# Altium footprint library sun_library.PcbLib: 412 footprints (part 22 of 26)
Each footprint in its own frame and in the unit in brackets; x right, y up, seen from the top. Pads: shape width x height; smd on the part's side, far side on the other; paste and mask are expansions set on the pad; w line width, h text height; cw(c..) or ccw(c..) is an arc to the next point about the centre after c.
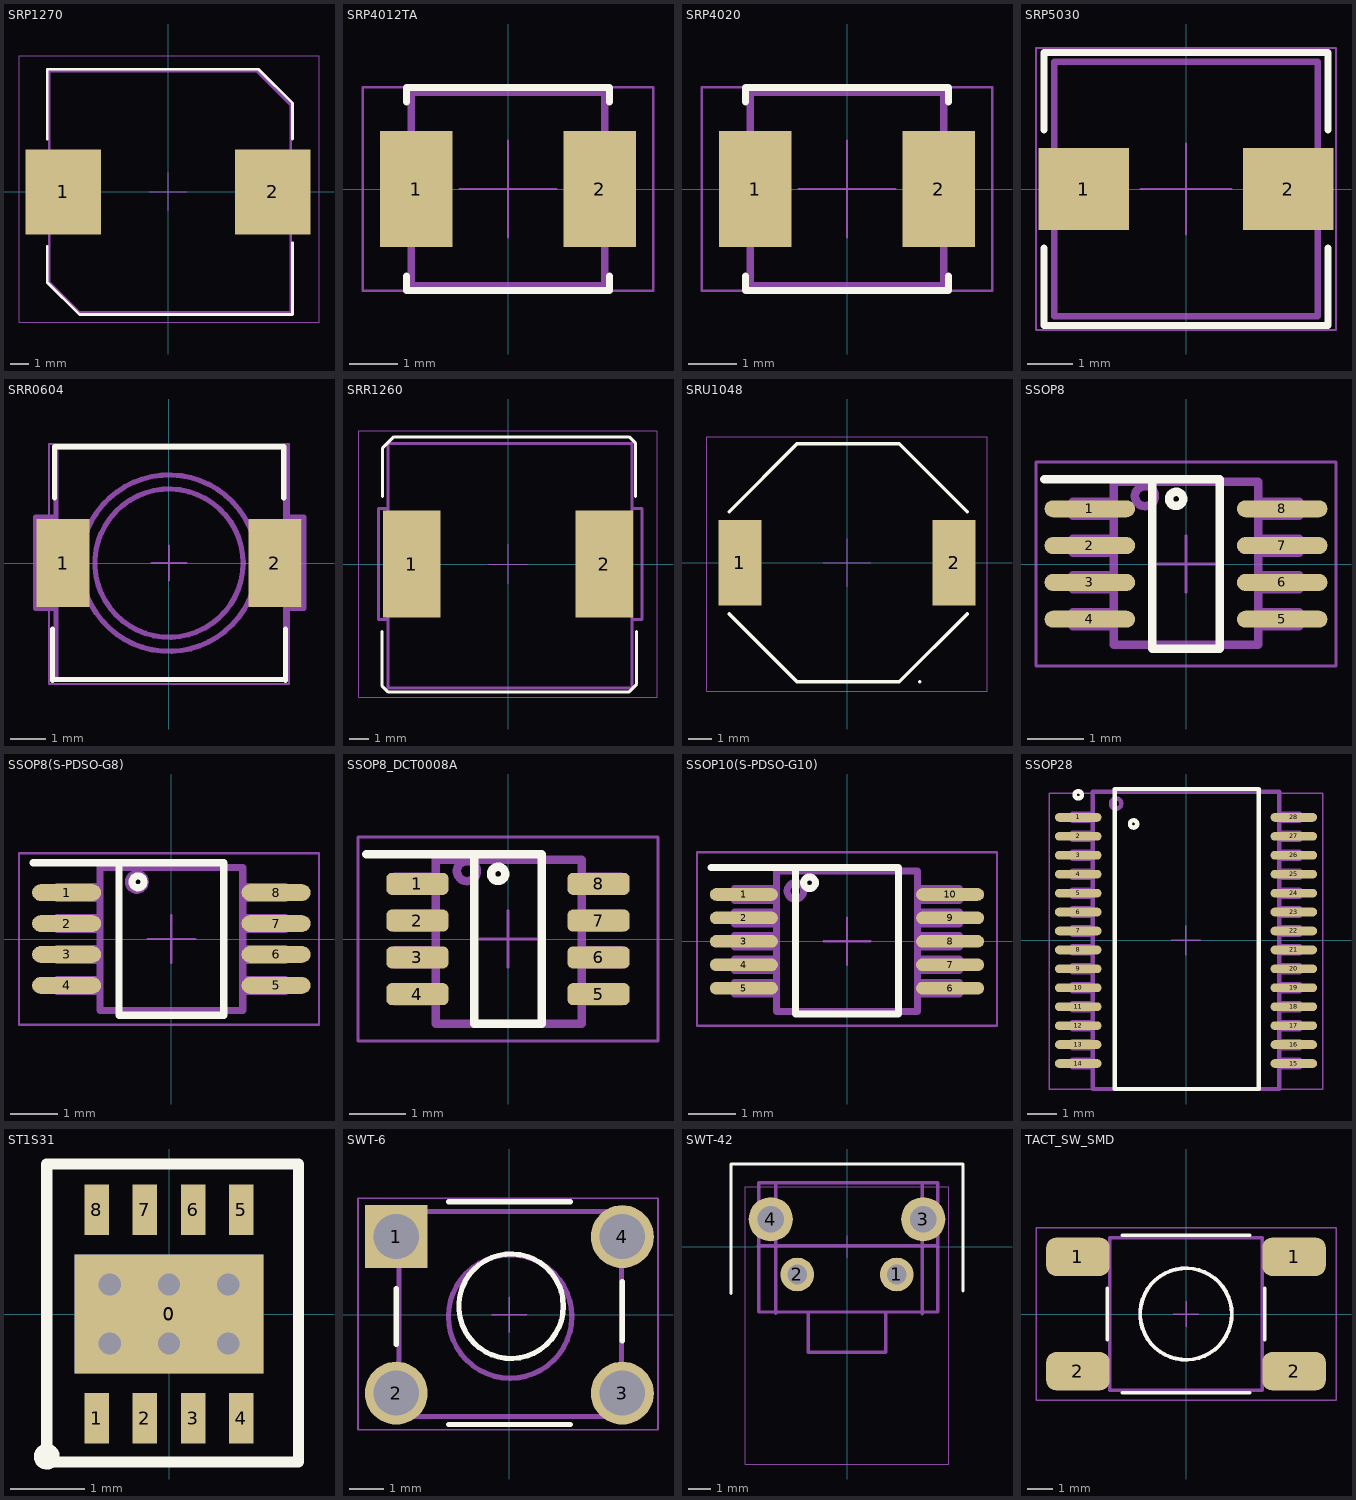
[diagram p21: the footprints below, top view; thin cyan lines are the x and y axes]

## SRP1270 [mm] "SMT power inductors, SRP1265A series BOURNS"
height 6.2
pads (2):
  rect 4x4.5 smd paste-2: 1(-5.55,0) 2(5.55,0)
Top Overlay:
  lines w0.15: -6.4,-2.9 -6.4,-4.8 -4.7,-6.5 6.6,-6.5 6.6,-2.7 ; -6.4,2.8 -6.4,6.5 4.8,6.5 6.6,4.7 6.6,2.8
Top Paste:
  region: -4,-0.3 -7.3,-0.3 -7.3,-2 -4,-2
  region: -4,2 -7.3,2 -7.3,0.3 -4,0.3
  rectangle: 4,-2 7.3,-0.3
  rectangle: 4,0.3 7.3,2
TopAssy 13:
  lines w0.15: -6.3,-2 -6.8,-2 -6.8,1.9 -6.3,1.9 ; 6.5,-2 7,-2 7,2.1 6.5,2.1 ; -6.3,-4.8 -6.3,6.4 4.7,6.4 6.5,4.6 6.5,-6.4 -4.7,-6.4 -6.3,-4.8
CourtTop 15:
  lines w0.05: -1,0 1,0 ; 0,-1 0,1 ; -7.9,-6.9 8,-6.9 8,7.2 -7.9,7.2 -7.9,-6.9
3D body "User Library-SRP1270_2RMR.step": height 7.01, standoff 0.01, extent -6.75,-6.847 6.95,6.847

## SRP4012TA [mm] "SMT power inductors, SRP4012TA series"
height 1
pads (2):
  rect 1.5x2.4 smd: 1(-1.9,0) 2(1.9,0)
Top Overlay:
  lines w0.15: -2.1,-1.8 -2.1,-2.1 2.1,-2.1 2.1,-1.8 ; -2.1,1.8 -2.1,2.1 2.1,2.1 2.1,1.8
TopAssy 13:
  lines w0.15: -2.2,-0.5 -2.2,0.5 -1.975,0.5 -1.975,-0.5 -2.2,-0.5 ; -2,-2 2,-2 2,2 -2,2 -2,-2 ; 1.975,-0.4 2.2,-0.4 2.2,0.6 1.975,0.6 1.975,-0.4
CourtTop 15:
  lines w0.05: -1,0 1,0 ; 0,-1 0,1 ; -3,-2.1 3,-2.1 3,2.1 -3,2.1 -3,-2.1
3D body "User Library-SRP-4020 Inductor.step": height 1.94, standoff -0.01, extent -2.15,-2 2.15,2

## SRP4020 [mm] "SMT power inductors, SRP4020 series, BOURNS"
height 1
pads (2):
  rect 1.5x2.4 smd: 1(-1.9,0) 2(1.9,0)
Top Overlay:
  lines w0.15: -2.1,-1.8 -2.1,-2.1 2.1,-2.1 2.1,-1.8 ; -2.1,1.8 -2.1,2.1 2.1,2.1 2.1,1.8
TopAssy 13:
  lines w0.15: -2.2,-0.5 -2.2,0.5 -1.975,0.5 -1.975,-0.5 -2.2,-0.5 ; -2,-2 2,-2 2,2 -2,2 -2,-2 ; 1.975,-0.4 2.2,-0.4 2.2,0.6 1.975,0.6 1.975,-0.4
CourtTop 15:
  lines w0.05: -1,0 1,0 ; 0,-1 0,1 ; -3,-2.1 3,-2.1 3,2.1 -3,2.1 -3,-2.1
3D body "User Library-SRP-4020 Inductor.step": height 1.94, standoff -0.01, extent -2.15,-2 2.15,2

## SRP5030 [mm] "SMT power inductors, SRP5030 series, BOURNS"
height 2.8
pads (2):
  rect 2x1.8 smd: 1(-2.25,0) 2(2.25,0)
Top Overlay:
  lines w0.15: -3.125,-1.3 -3.125,-3 3.125,-3 3.125,-1.3 ; -3.125,1.3 -3.125,3 3.125,3 3.125,1.3
TopAssy 13:
  lines w0.15: -3.1,-0.8 -3.1,0.8 -2.7,0.8 -2.7,-0.8 -3.1,-0.8 ; -2.9,-2.8 2.9,-2.8 2.9,2.8 -2.9,2.8 -2.9,-2.8 ; 2.7,-0.8 3.1,-0.8 3.1,0.8 2.7,0.8 2.7,-0.8
CourtTop 15:
  lines w0.05: -1,0 1,0 ; 0,-1 0,1 ; -3.3,-3.1 3.3,-3.1 3.3,3.1 -3.3,3.1 -3.3,-3.1
3D body "User Library-SRP-5030 Inductor.step": height 2.79, standoff -0.01, extent -3,-2.85 3,2.85

## SRR0604 [mm] "Shielded Power Inductors SRR0604 Bourns"
height 4.8
pads (2):
  rect 1.5x2.5 smd: 1(-3,0) 2(3,0)
Top Overlay:
  lines w0.15: -3.3,-3.323 -3.3,-1.877 ; -3.245,-3.3 3.255,-3.3 ; -3.245,1.855 -3.245,3.3 3.255,3.3 3.255,1.855 ; 3.3,-3.323 3.3,-1.877
TopAssy 13:
  circle w0.15: c0,0 r2.5
  circle w0.15: c0,0 r2.1
  lines w0.15: -3.2,-1.275 -3.775,-1.275 -3.775,1.3 -3.2,1.3 ; 3.3,-1.275 3.825,-1.275 3.825,1.3 3.3,1.3 ; -3.2,-3.3 -3.2,3.3 3.3,3.3 3.3,-3.3 -3.2,-3.3
CourtTop 15:
  lines w0.05: -0.5,0 0.5,0 ; 0,-0.5 0,0.5 ; -3.4,-3.425 3.4,-3.425 3.4,3.375 -3.4,3.375 -3.4,-3.425
3D body "User Library-IND-SRR0604_6x6x5.step": height 4.8, standoff 0, extent -3.2,-3.25 3.3,3.25

## SRR1260 [mm] "SMT power inductors, SRP1260 series BOURNS"
height 6.2
pads (2):
  rect 2.9x5.4 smd paste-2: 1(-4.85,0) 2(4.85,0)
Top Overlay:
  lines w0.15: -6.35,-3.4 -6.35,-6.125 -6.025,-6.45 6.075,-6.45 6.475,-6.05 6.475,-3.4 ; -6.325,3.4 -6.325,5.825 -5.75,6.4 6.1,6.4 6.425,6.075 6.425,3.4
Top Paste:
  rectangle: 3.5,0.275 6.2,2.5
  region: 6.2,-0.275 3.5,-0.275 3.5,-2.5 6.2,-2.5
  region: -3.5,-0.275 -6.2,-0.275 -6.2,-2.5 -3.5,-2.5
  rectangle: -6.2,0.275 -3.5,2.5
TopAssy 13:
  lines w0.15: -6.05,-2.8 -6.525,-2.8 -6.525,2.8 -6.05,2.8 ; 6.238,-2.8 6.738,-2.8 6.738,2.8 6.238,2.8 ; -6.05,-6.25 -6.05,6.075 6.238,6.075 6.238,-6.25 -6.05,-6.25
CourtTop 15:
  lines w0.05: -1,0 1,0 ; 0,-1 0,1 ; -7.5,-6.7 -7.5,6.7 7.5,6.7 7.5,-6.7 -7.5,-6.7
3D body "User Library-SRR1260-680M.step": height 6.3, standoff 0.01, extent -6.25,-6.25 6.25,6.25

## SRU1048 [mm] "SMT power inductors,  SRU1048 series BOURNS"
height 4.8
pads (2):
  rect 1.8x3.6 smd: 1(-4.5,0) 2(4.5,0)
Top Overlay:
  lines w0.15: -4.95,-2.15 -2.1,-5 2.2,-5 5.05,-2.15 ; -4.95,2.15 -2.1,5 2.2,5 5.05,2.15 ; 3.05,-5 3.05,-5
CourtTop 15:
  lines w0.05: -1,0 1,0 ; 0,-1 0,1 ; -5.9,-5.4 -5.9,5.3 5.9,5.3 5.9,-5.4 -5.9,-5.4
3D body "User Library-Bourns_SRU1048.step": height 5.04, standoff 0, extent -4.95,-5 5.05,5

## SSOP8 [mm] "TSOP, 8-Leads, Body 3x4.4mm, Pitch 0.65mm, IPC Medium Density"
height 1.2
pads (8):
  oval 1.6x0.3 smd: 1(-1.7,0.975) 2(-1.7,0.325) 3(-1.7,-0.325) 4(-1.7,-0.975) 5(1.7,-0.975) 6(1.7,-0.325) 7(1.7,0.325) 8(1.7,0.975)
Top Overlay:
  circle w0.15: c-0.175,1.15 r0.125
  lines w0.15: -2.5,1.5 0.6,1.5 0.6,-1.5 -0.6,-1.5 -0.6,1.5
TopAssy 13:
  circle w0.15: c-0.725,1.2 r0.177
  lines w0.15: -1.275,-1.1 -2,-1.1 -2,-0.85 -1.275,-0.85 ; -1.275,-0.45 -2,-0.45 -2,-0.2 -1.275,-0.2 ; -1.275,0.2 -2,0.2 -2,0.45 -1.275,0.45 ; -1.275,0.85 -2,0.85 -2,1.1 -1.275,1.1 ; 1.275,-1.1 2,-1.1 2,-0.85 1.275,-0.85 ; 1.275,-0.45 2,-0.45 2,-0.2 1.275,-0.2 ; 1.275,0.2 2,0.2 2,0.45 1.275,0.45 ; 1.275,0.85 2,0.85 2,1.1 1.275,1.1 ; -1.275,-1.425 1.275,-1.425 1.275,1.45 -1.275,1.45 -1.275,-1.425
CourtTop 15:
  lines w0.05: -0.5,0 0.5,0 ; 0,-0.5 0,0.5 ; -2.65,-1.8 2.65,-1.8 2.65,1.8 -2.65,1.8 -2.65,-1.8
3D body "User Library-SSOP-8-P-0_65.step": height 1.15, standoff 0, extent -2,-1.475 2,1.425

## SSOP8(S-PDSO-G8) [mm] "TSOP, 8-Leads, Body 3x5mm, Pitch 0.65mm, IPC Medium Density"
height 1.2
pads (8):
  oval 1.45x0.35 smd mask+0.075: 1(-2.2,0.975) 2(-2.2,0.325) 3(-2.2,-0.325) 4(-2.2,-0.975) 5(2.2,-0.975) 6(2.2,-0.325) 7(2.2,0.325) 8(2.2,0.975)
Top Overlay:
  circle w0.15: c-0.7,1.2 r0.125
  lines w0.15: -2.9,1.6 1.1,1.6 1.1,-1.6 -1.1,-1.6 -1.1,1.6
TopAssy 13:
  circle w0.15: c-0.725,1.2 r0.177
  lines w0.15: -1.5,-1.1 -2.4,-1.1 -2.4,-0.85 -1.5,-0.85 ; -1.5,-0.45 -2.4,-0.45 -2.4,-0.2 -1.5,-0.2 ; -1.5,0.2 -2.4,0.2 -2.4,0.45 -1.5,0.45 ; -1.5,0.85 -2.4,0.85 -2.4,1.1 -1.5,1.1 ; 1.5,-1.1 2.4,-1.1 2.4,-0.85 1.5,-0.85 ; 1.5,-0.45 2.4,-0.45 2.4,-0.2 1.5,-0.2 ; 1.5,0.2 2.4,0.2 2.4,0.45 1.5,0.45 ; 1.5,0.85 2.4,0.85 2.4,1.1 1.5,1.1 ; -1.5,-1.5 1.5,-1.5 1.5,1.5 -1.5,1.5 -1.5,-1.5
CourtTop 15:
  lines w0.05: -0.5,0 0.5,0 ; 0,-0.5 0,0.5 ; -3.2,-1.8 -3.2,1.8 3.1,1.8 3.1,-1.8 -3.2,-1.8
3D body "User Library-S-PDSO-G8.STEP": height 0.94, standoff -0.02, extent -2.451,-1.499 2.451,1.498

## SSOP8_DCT0008A [mm] "TSOP, 8-Leads, Body 3x4.4mm, Pitch 0.65mm, IPC Medium Density"
height 1.2
pads (8):
  rrect50% 1.1x0.39 smd mask+0.075: 1(-1.6,0.975) 2(-1.6,0.325) 3(-1.6,-0.325) 4(-1.6,-0.975) 5(1.6,-0.975) 6(1.6,-0.325) 7(1.6,0.325) 8(1.6,0.975)
Top Overlay:
  circle w0.15: c-0.175,1.15 r0.125
  lines w0.15: -2.5,1.5 0.6,1.5 0.6,-1.5 -0.6,-1.5 -0.6,1.5
TopAssy 13:
  circle w0.15: c-0.725,1.2 r0.177
  lines w0.15: -1.275,-1.1 -2,-1.1 -2,-0.85 -1.275,-0.85 ; -1.275,-0.45 -2,-0.45 -2,-0.2 -1.275,-0.2 ; -1.275,0.2 -2,0.2 -2,0.45 -1.275,0.45 ; -1.275,0.85 -2,0.85 -2,1.1 -1.275,1.1 ; 1.275,-1.1 2,-1.1 2,-0.85 1.275,-0.85 ; 1.275,-0.45 2,-0.45 2,-0.2 1.275,-0.2 ; 1.275,0.2 2,0.2 2,0.45 1.275,0.45 ; 1.275,0.85 2,0.85 2,1.1 1.275,1.1 ; -1.275,-1.5 -1.275,1.4 1.3,1.4 1.3,-1.5 -1.275,-1.5
CourtTop 15:
  lines w0.05: -0.5,0 0.5,0 ; 0,-0.5 0,0.5 ; -2.65,-1.8 -2.65,1.8 2.65,1.8 2.65,-1.8 -2.65,-1.8
3D body "User Library-SSOP-8-P-0_65.step": height 1.15, standoff 0, extent -2,-1.475 2,1.425

## SSOP10(S-PDSO-G10) [mm] "TSOP, 10-Leads, Body 3x5mm, Pitch 0.65mm, IPC Medium Density"
height 1.2
pads (10):
  oval 1.45x0.27 smd mask+0.05: 1(-2.2,1) 2(-2.2,0.5) 3(-2.2,0) 4(-2.2,-0.5) 5(-2.2,-1) 6(2.2,-1) 7(2.2,-0.5) 8(2.2,0) 9(2.2,0.5) 10(2.2,1)
Top Overlay:
  circle w0.15: c-0.8,1.25 r0.125
  lines w0.15: -2.9,1.575 1.1,1.575 1.1,-1.55 -1.1,-1.55 -1.1,1.575
TopAssy 13:
  circle w0.15: c-1.1,1.075 r0.177
  lines w0.15: -1.5,-1.125 -2.4,-1.125 -2.4,-0.875 -1.5,-0.875 ; -1.5,-0.625 -2.4,-0.625 -2.4,-0.375 -1.5,-0.375 ; -1.5,-0.125 -2.4,-0.125 -2.4,0.125 -1.5,0.125 ; -1.5,0.375 -2.4,0.375 -2.4,0.625 -1.5,0.625 ; -1.5,0.875 -2.4,0.875 -2.4,1.125 -1.5,1.125 ; 1.5,-1.125 2.4,-1.125 2.4,-0.875 1.5,-0.875 ; 1.5,-0.625 2.4,-0.625 2.4,-0.375 1.5,-0.375 ; 1.5,-0.125 2.4,-0.125 2.4,0.125 1.5,0.125 ; 1.5,0.375 2.4,0.375 2.4,0.625 1.5,0.625 ; 1.5,0.875 2.4,0.875 2.4,1.125 1.5,1.125 ; -1.5,-1.5 -1.5,1.5 1.5,1.5 1.5,-1.5 -1.5,-1.5
CourtTop 15:
  lines w0.05: -0.5,0 0.5,0 ; 0,-0.5 0,0.5 ; -3.2,-1.8 3.2,-1.8 3.2,1.9 -3.2,1.9 -3.2,-1.8
3D body "User Library-TSSOP-10.step": height 1.1, standoff 0, extent -2.5,-1.5 2.5,1.5

## SSOP28 [mm] "TSOP, 28-Leads"
height 1.2
pads (28):
  oval 1.6x0.3 smd: 1(-3.7,4.225) 2(-3.7,3.575) 3(-3.7,2.925) 4(-3.7,2.275) 5(-3.7,1.625) 6(-3.7,0.975) 7(-3.7,0.325) 8(-3.7,-0.325) 9(-3.7,-0.975) 10(-3.7,-1.625) 11(-3.7,-2.275) 12(-3.7,-2.925) 13(-3.7,-3.575) 14(-3.7,-4.225) 15(3.7,-4.225) 16(3.7,-3.575) 17(3.7,-2.925) 18(3.7,-2.275) 19(3.7,-1.625) 20(3.7,-0.975) 21(3.7,-0.325) 22(3.7,0.325) 23(3.7,0.975) 24(3.7,1.625) 25(3.7,2.275) 26(3.7,2.925) 27(3.7,3.575) 28(3.7,4.225)
Top Overlay:
  circle w0.15: c-1.8,4 r0.125
  circle w0.15: c-3.7,5 r0.125
  lines w0.15: -2.45,-5.1 -2.45,5.2 2.5,5.2 2.5,-5.1 -2.45,-5.1
TopAssy 13:
  circle w0.15: c-2.4,4.7 r0.177
  lines w0.15: -3.2,-4.35 -3.9,-4.35 -3.9,-4.1 -3.2,-4.1 ; -3.2,-3.7 -3.9,-3.7 -3.9,-3.45 -3.2,-3.45 ; -3.2,-3.05 -3.9,-3.05 -3.9,-2.8 -3.2,-2.8 ; -3.2,-2.4 -3.9,-2.4 -3.9,-2.15 -3.2,-2.15 ; -3.2,-1.75 -3.9,-1.75 -3.9,-1.5 -3.2,-1.5 ; -3.2,-1.1 -3.9,-1.1 -3.9,-0.85 -3.2,-0.85 ; -3.2,-0.45 -3.9,-0.45 -3.9,-0.2 -3.2,-0.2 ; -3.2,0.2 -3.9,0.2 -3.9,0.45 -3.2,0.45 ; -3.2,0.85 -3.9,0.85 -3.9,1.1 -3.2,1.1 ; -3.2,1.5 -3.9,1.5 -3.9,1.75 -3.2,1.75 ; -3.2,2.15 -3.9,2.15 -3.9,2.4 -3.2,2.4 ; -3.2,2.8 -3.9,2.8 -3.9,3.05 -3.2,3.05 ; -3.2,3.45 -3.9,3.45 -3.9,3.7 -3.2,3.7 ; -3.2,4.1 -3.9,4.1 -3.9,4.35 -3.2,4.35 ; 3.2,-4.35 3.9,-4.35 3.9,-4.1 3.2,-4.1 ; 3.2,-3.7 3.9,-3.7 3.9,-3.45 3.2,-3.45 ; 3.2,-3.05 3.9,-3.05 3.9,-2.8 3.2,-2.8 ; 3.2,-2.4 3.9,-2.4 3.9,-2.15 3.2,-2.15 ; 3.2,-1.75 3.9,-1.75 3.9,-1.5 3.2,-1.5 ; 3.2,-1.1 3.9,-1.1 3.9,-0.85 3.2,-0.85 ; 3.2,-0.45 3.9,-0.45 3.9,-0.2 3.2,-0.2 ; 3.2,0.2 3.9,0.2 3.9,0.45 3.2,0.45 ; 3.2,0.85 3.9,0.85 3.9,1.1 3.2,1.1 ; 3.2,1.5 3.9,1.5 3.9,1.75 3.2,1.75 ; 3.2,2.15 3.9,2.15 3.9,2.4 3.2,2.4 ; 3.2,2.8 3.9,2.8 3.9,3.05 3.2,3.05 ; 3.2,3.45 3.9,3.45 3.9,3.7 3.2,3.7 ; 3.2,4.1 3.9,4.1 3.9,4.35 3.2,4.35 ; -3.2,-5.1 -3.2,5.1 3.2,5.1 3.2,-5.1 -3.2,-5.1
CourtTop 15:
  lines w0.05: -0.5,0 0.5,0 ; 0,-0.5 0,0.5 ; -4.7,-5.1 -4.7,5.05 4.7,5.05 4.7,-5.1 -4.7,-5.1
3D body "User Library-SSOP-28-2_FT232RL.step": height 1.99, standoff -0.01, extent -3.906,-5.1 3.906,5.1

## ST1S31 [mm]
pads (10):
  rect 2.55x1.6 smd far side: 0(0,0)
  rect 2.55x1.6 smd mask+0.075: 0(0,0)
  rect 0.33x0.68 smd mask+0.075: 1(-0.975,-1.405) 2(-0.325,-1.405) 3(0.325,-1.405) 4(0.975,-1.405) 5(0.975,1.405) 6(0.325,1.405) 7(-0.325,1.405) 8(-0.975,1.405)
via 0.8,-0.4 diameter 0.6 hole 0.3
via -0.8,-0.4 diameter 0.6 hole 0.3
via 0,-0.4 diameter 0.6 hole 0.3
via 0,0.4 diameter 0.6 hole 0.3
via 0.8,0.4 diameter 0.6 hole 0.3
via -0.8,0.4 diameter 0.6 hole 0.3
Top Overlay:
  circle w0.15: c-1.65,-1.925 r0.1
  lines w0.15: -1.65,-2 -1.65,2.025 1.75,2.025 1.75,-2 -1.65,-2
3D body "User Library-DFN8_3x3mm__65mm.step": height 0.8, standoff 0, extent -1.5,-1.5 1.5,1.52

## SWT-6 [mm]
pads (4):
  rect 1.81x1.81 hole 1.3: 1(-3.25,2.25)
  round 1.81 hole 1.3: 2(-3.25,-2.25) 3(3.25,-2.25) 4(3.25,2.25)
Top Overlay:
  circle w0.15: c0.05,0.25 r1.503
  lines w0.15: -3.25,-0.85 -3.25,0.75 ; -1.75,-3.15 1.75,-3.15 ; -1.75,3.25 1.75,3.25 ; 3.25,-0.75 3.25,0.95
TopAssy 13:
  circle w0.15: c0.025,-0.05 r1.773
  lines w0.15: -3.225,1.775 -3.5,1.775 -3.5,2.7 -3.225,2.7 ; -3.175,-2.625 -3.45,-2.625 -3.45,-1.7 -3.175,-1.7 ; 3.225,-2.65 3.5,-2.65 3.5,-1.725 3.225,-1.725 ; 3.225,1.75 3.5,1.75 3.5,2.675 3.225,2.675 ; -3.175,-2.925 3.225,-2.925 3.225,2.975 -3.175,2.975 -3.175,-2.925
CourtTop 15:
  lines w0.05: -0.5,0 0.5,0 ; 0,-0.5 0,0.5 ; -4.35,-3.3 -4.35,3.35 4.275,3.35 4.275,-3.3 -4.35,-3.3
3D body "SWT2.STEP": height 5.4, standoff -4.5, extent -3.993,-2.957 3.843,3.043

## SWT-42 [mm] "Кнопка под прямой угол"
pads (4):
  round 1.524 hole 0.9: 1(2.25,-1.25) 2(-2.25,-1.25)
  round 2 hole 1.2: 3(3.45,1.25) 4(-3.45,1.25)
Top Overlay:
  lines w0.15: -5.25,-2.1 -5.25,3.75 -3.75,3.75 3.75,3.75 5.25,3.75 5.25,-2
TopAssy 13:
  lines w0.15: -4.025,0.05 4.1,0.05 ; -3.925,0.625 -3.225,0.625 ; -3.925,1.8 -3.225,1.8 ; -3.225,-3 -3.225,2.85 ; -1.75,-2.95 -1.75,-4.775 1.75,-4.775 1.75,-2.95 ; 3.4,-3.025 3.4,2.825 ; 3.4,0.75 4.1,0.75 ; 3.4,1.925 4.1,1.925 ; -4,-2.95 4.1,-2.95 4.1,2.9 -4,2.9 -4,-2.95
CourtTop 15:
  lines w0.05: -0.5,0 0.5,0 ; 0,-0.5 0,0.5 ; -4.6,-9.825 4.6,-9.825 4.6,2.725 -4.6,2.725 -4.6,-9.825
3D body "User Library-SWT6-R6K.STEP": height 7.8, standoff -3.5, extent -4.048,-9.75 4.15,2.6

## TACT_SW_SMD [mm] "IT-1102WA, кнопка тактовая 6х6 SMD h=5мм"
height 5
pads (4):
  rrect50% 2.5x1.5 smd: 1(-4.25,2.25) 1(4.25,2.25) 2(-4.25,-2.25) 2(4.25,-2.25)
Top Overlay:
  circle w0.15: c0,0 r1.8
  lines w0.15: -3.1,-1 -3.1,1 ; -2.5,-3.1 2.5,-3.1 ; -2.5,3.1 2.5,3.1 ; 3.1,-1 3.1,1
TopAssy 13:
  circle w0.15: c0,0 r1.8
  lines w0.15: -3,-2.6 -4.525,-2.6 -4.525,-1.9 -3,-1.9 ; -3,1.9 -4.525,1.9 -4.525,2.6 -3,2.6 ; 3,-2.6 4.525,-2.6 4.525,-1.9 3,-1.9 ; 3,1.9 4.525,1.9 4.525,2.6 3,2.6 ; -3,-3 -3,3 3,3 3,-3 -3,-3
CourtTop 15:
  lines w0.05: -0.5,0 0.5,0 ; 0,-0.5 0,0.5 ; -5.9,-3.4 5.9,-3.4 5.9,3.4 -5.9,3.4 -5.9,-3.4
3D body "User Library-PTS645SL50SMTR92-LFS.STEP": height 5, standoff 0, extent -4.5,-3 4.5,3